# Altium integrated library A.Mohebbi.IntLib: 48 symbols (part 2 of 3)

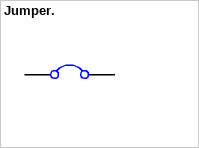
[diagram p23: symbol Jumper.]

## Jumper.
designator J?, comment Jumper  (value not drawn)
LatestRevisionDate: 17-Jul-2002; LatestRevisionNote: Re-released for DXP Platform.; Publisher: Altium Limited
footprint Jumper_SMD
footprint Jumper.
pins: 1, 2


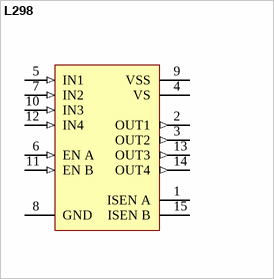
[diagram p24: symbol L298]

## L298
designator L298  (value not drawn)
LatestRevisionDate: 17-Jul-2002; LatestRevisionNote: Re-released for DXP Platform.; Publisher: Altium Limited
footprint Multiwatt_15
footprint Multiwatt_15_Right
pins: 1 ISEN A, 2 OUT1 (out), 3 OUT2 (out), 4 VS (power), 5 IN1 (in), 6 EN A (in), 7 IN2 (in), 8 GND (power), 9 VSS (power), 10 IN3 (in), 11 EN B (in), 12 IN4 (in), 13 OUT3 (out), 14 OUT4 (out), 15 ISEN B


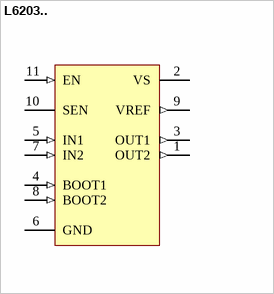
[diagram p25: symbol L6203..]

## L6203..
designator L6203  (value not drawn)
L6203; LatestRevisionDate: 17-Jul-2002; LatestRevisionNote: Re-released for DXP Platform.; Publisher: Altium Limited
footprint Multiwatt_11
pins: 1 OUT2 (out), 2 VS (power), 3 OUT1 (out), 4 BOOT1 (in), 5 IN1 (in), 6 GND (power), 7 IN2 (in), 8 BOOT2 (in), 9 VREF (out), 10 SEN, 11 EN (in)


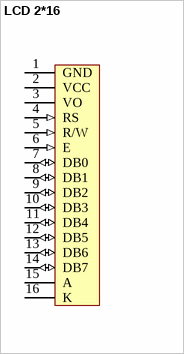
[diagram p26: symbol LCD 2*16]

## LCD 2*16
designator LCD 2*16  (value not drawn)
LatestRevisionDate: 17-Jul-2002; LatestRevisionNote: Re-released for DXP Platform.; Publisher: Altium Limited
footprint LCD 2*16
pins: 1 GND (power), 2 VCC (power), 3 VO, 4 RS (in), 5 R/W (in), 6 E (in), 7 DB0 (io), 8 DB1 (io), 9 DB2 (io), 10 DB3 (io), 11 DB4 (io), 12 DB5 (io), 13 DB6 (io), 14 DB7 (io), 15 A, 16 K


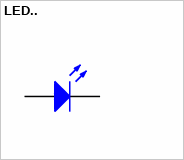
[diagram p27: symbol LED..]

## LED..
designator LED?, comment LED  (value not drawn)
LatestRevisionDate: 17-Jul-2002; LatestRevisionNote: Re-released for DXP Platform.; Publisher: Altium Limited
footprint LED_5mm_G
footprint LED_5MM_R
footprint LED_5mm_Y
footprint LED_3mm_G
footprint LED_3mm_R
footprint LED_3mm_Y
pins: A, K


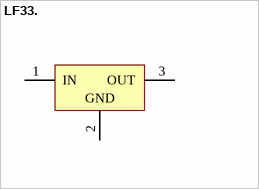
[diagram p28: symbol LF33.]

## LF33.
designator LF33, comment LF33  (value not drawn)
LatestRevisionDate: 17-Jul-2002; LatestRevisionNote: Re-released for DXP Platform.; Publisher: Altium Limited
footprint TO_220
footprint TO_220_Right
footprint TO_252
pins: 1 IN (power), 2 GND (power), 3 OUT (power)


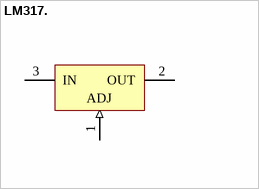
[diagram p29: symbol LM317.]

## LM317.
designator LM317, comment LM317  (value not drawn)
LatestRevisionDate: 17-Jul-2002; LatestRevisionNote: Re-released for DXP Platform.; Publisher: Altium Limited
footprint TO_220
footprint TO_03
pins: 1 ADJ (in), 2 OUT (power), 3 IN (power)


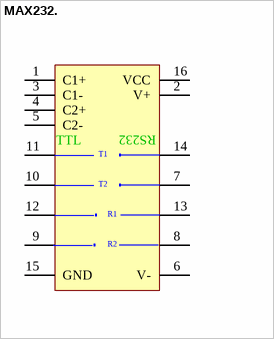
[diagram p30: symbol MAX232.]

## MAX232.
designator MAX232, comment MAX232  (value not drawn)
LatestRevisionDate: 17-Jul-2002; LatestRevisionNote: Re-released for DXP Platform.; Publisher: Altium Limited
footprint DIP_16
footprint SO_16
pins: 1 C1+, 2 V+, 3 C1-, 4 C2+, 5 C2-, 6 V-, 7 T2OUT, 8 R2IN, 9 R2OUT, 10 T2IN, 11 T1IN, 12 R1OUT, 13 R1IN, 14 T1OUT, 15 GND (power), 16 VCC (power)
text: TTL; RS232; T1; T2; R1; R2


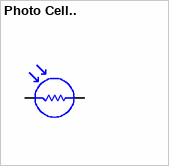
[diagram p31: symbol Photo Cell..]

## Photo Cell..
designator Photo Cell?, comment Photo Cell  (value not drawn)
LatestRevisionDate: 17-Jul-2002; LatestRevisionNote: Re-released for DXP Platform.; Publisher: Altium Limited
footprint PhotoCell.
pins: 1, 2


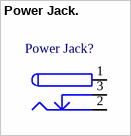
[diagram p32: symbol Power Jack.]

## Power Jack.
designator Power Jack?  (value not drawn)
footprint Power Jack.
pins: 1 (power), 2 (power), 3 (power)


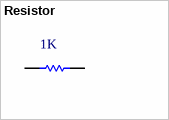
[diagram p33: symbol Resistor]

## Resistor
designator R?, comment value 1K  (hidden comment: Resistor 0.25w)
LatestRevisionDate: 17-Jul-2002; LatestRevisionNote: Re-released for DXP Platform.; Publisher: Altium Limited
footprint Res_0.25w
footprint Resistor_0.25W_Stand
footprint Resistor_0.5W
footprint Resistor_3W
footprint Resistor_SMD_1206
footprint Resistor_SMD_0805
footprint Resistor_SMD_0603
pins: 1, 2


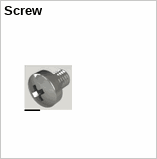
[diagram p34: symbol Screw]

## Screw
designator Screw?  (value not drawn)
LatestRevisionDate: 17-Jul-2002; LatestRevisionNote: Re-released for DXP Platform.; Publisher: Altium Limited
footprint Screw
pins: S


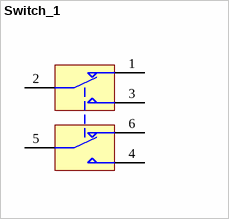
[diagram p35: symbol Switch_1]

## Switch_1
designator SW, comment Switch  (value not drawn)
LatestRevisionDate: 17-Jul-2002; LatestRevisionNote: Re-released for DXP Platform.; Publisher: Altium Limited
footprint SW_1
pins: 1, 2, 3, 4, 5, 6


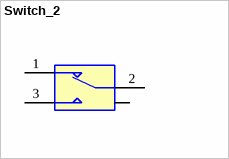
[diagram p36: symbol Switch_2]

## Switch_2
designator SW, comment Switch  (value not drawn)
LatestRevisionDate: 17-Jul-2002; LatestRevisionNote: Re-released for DXP Platform.; Publisher: Altium Limited
footprint SW_2
footprint SW_3
pins: 1, 2, 3, MH (power)


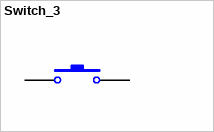
[diagram p37: symbol Switch_3]

## Switch_3
designator SW?, comment Switch  (value not drawn)
LatestRevisionDate: 17-Jul-2002; LatestRevisionNote: Re-released for DXP Platform.; Publisher: Altium Limited
footprint SW_2pin
footprint SW_4pin
pins: 1, 2


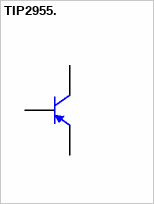
[diagram p38: symbol TIP2955.]

## TIP2955.
designator TIP2955, comment TIP2955  (value not drawn)
LatestRevisionDate: 17-Jul-2002; LatestRevisionNote: Re-released for DXP Platform.; Publisher: Altium Limited
footprint TO_247
footprint TO_247_Right
pins: 1 B, 2 C, 3 E


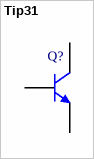
[diagram p39: symbol Tip31]

## Tip31
designator Q?  (value not drawn)
footprint Tip31_TO220
pins: 1 B, 2 C, 3 E


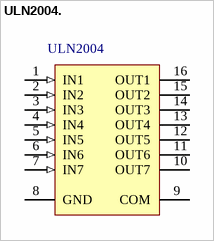
[diagram p40: symbol ULN2004.]

## ULN2004.
designator ULN2004, comment ULN2004  (value not drawn)
ULN2004.
footprint ULN2004
footprint ULN2004_SMD
pins: 1 IN1 (in), 2 IN2 (in), 3 IN3 (in), 4 IN4 (in), 5 IN5 (in), 6 IN6 (in), 7 IN7 (in), 8 GND (power), 9 COM, 10 OUT7 (oc), 11 OUT6 (oc), 12 OUT5 (oc), 13 OUT4 (oc), 14 OUT3 (oc), 15 OUT2 (oc), 16 OUT1 (oc)


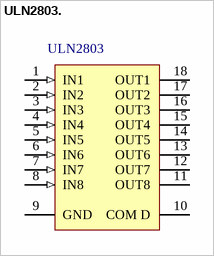
[diagram p41: symbol ULN2803.]

## ULN2803.
designator ULN2803  (value not drawn)
footprint ULN2803
pins: 1 IN1 (in), 2 IN2 (in), 3 IN3 (in), 4 IN4 (in), 5 IN5 (in), 6 IN6 (in), 7 IN7 (in), 8 IN8 (in), 9 GND (power), 10 COM D, 11 OUT8 (oc), 12 OUT7 (oc), 13 OUT6 (oc), 14 OUT5 (oc), 15 OUT4 (oc), 16 OUT3 (oc), 17 OUT2 (oc), 18 OUT1 (oc)


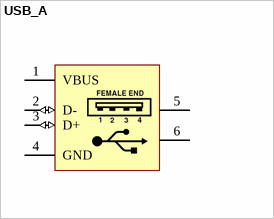
[diagram p42: symbol USB_A]

## USB_A
designator USB A?, comment USB A  (value not drawn)
LatestRevisionDate: 17-Jul-2002; LatestRevisionNote: Re-released for DXP Platform.; Publisher: Altium Limited
footprint USB_A.1
footprint USB_A.2
footprint USB_A.3
pins: 1 VBUS (power), 2 D- (io), 3 D+ (io), 4 GND (power), 5 MH (power), 6 MH (power)


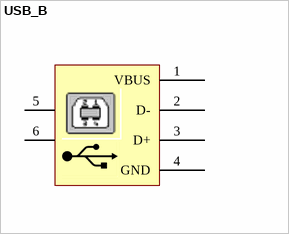
[diagram p43: symbol USB_B]

## USB_B
designator USB B?  (value not drawn)
USB B; LatestRevisionDate: 17-Jul-2002; LatestRevisionNote: Re-released for DXP Platform.; Publisher: Altium Limited
footprint USB_B.1
footprint USB_B.2
footprint USB_B.3
pins: 1 VBUS (power), 2 D-, 3 D+, 4 GND (power), 5, 6


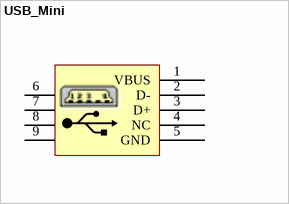
[diagram p44: symbol USB_Mini]

## USB_Mini
designator USB Mini?  (value not drawn)
USB Mini; LatestRevisionDate: 17-Jul-2002; LatestRevisionNote: Re-released for DXP Platform.; Publisher: Altium Limited
footprint USB_Mini.1
footprint USB_Mini.2
pins: 1 VBUS (power), 2 D-, 3 D+, 4 NC (power), 5 GND (power), 6, 7, 8, 9


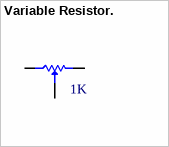
[diagram p45: symbol Variable Resistor.]

## Variable Resistor.
designator VR, comment value 1K  (hidden comment: Variable Resistor)
LatestRevisionDate: 17-Jul-2002; LatestRevisionNote: Re-released for DXP Platform.; Publisher: Altium Limited
footprint POT.
footprint Multi Turn.
footprint Volume.
pins: 1 CCW, 2 CW, 3 Setpoint
